# Altium footprint library JEDEC_G.PcbLib: 194 footprints (part 10 of 13)
Each footprint in its own frame and in the unit in brackets; x right, y up, seen from the top. Pads: shape width x height; smd on the part's side, far side on the other; paste and mask are expansions set on the pad; w line width, h text height; cw(c..) or ccw(c..) is an arc to the next point about the centre after c.
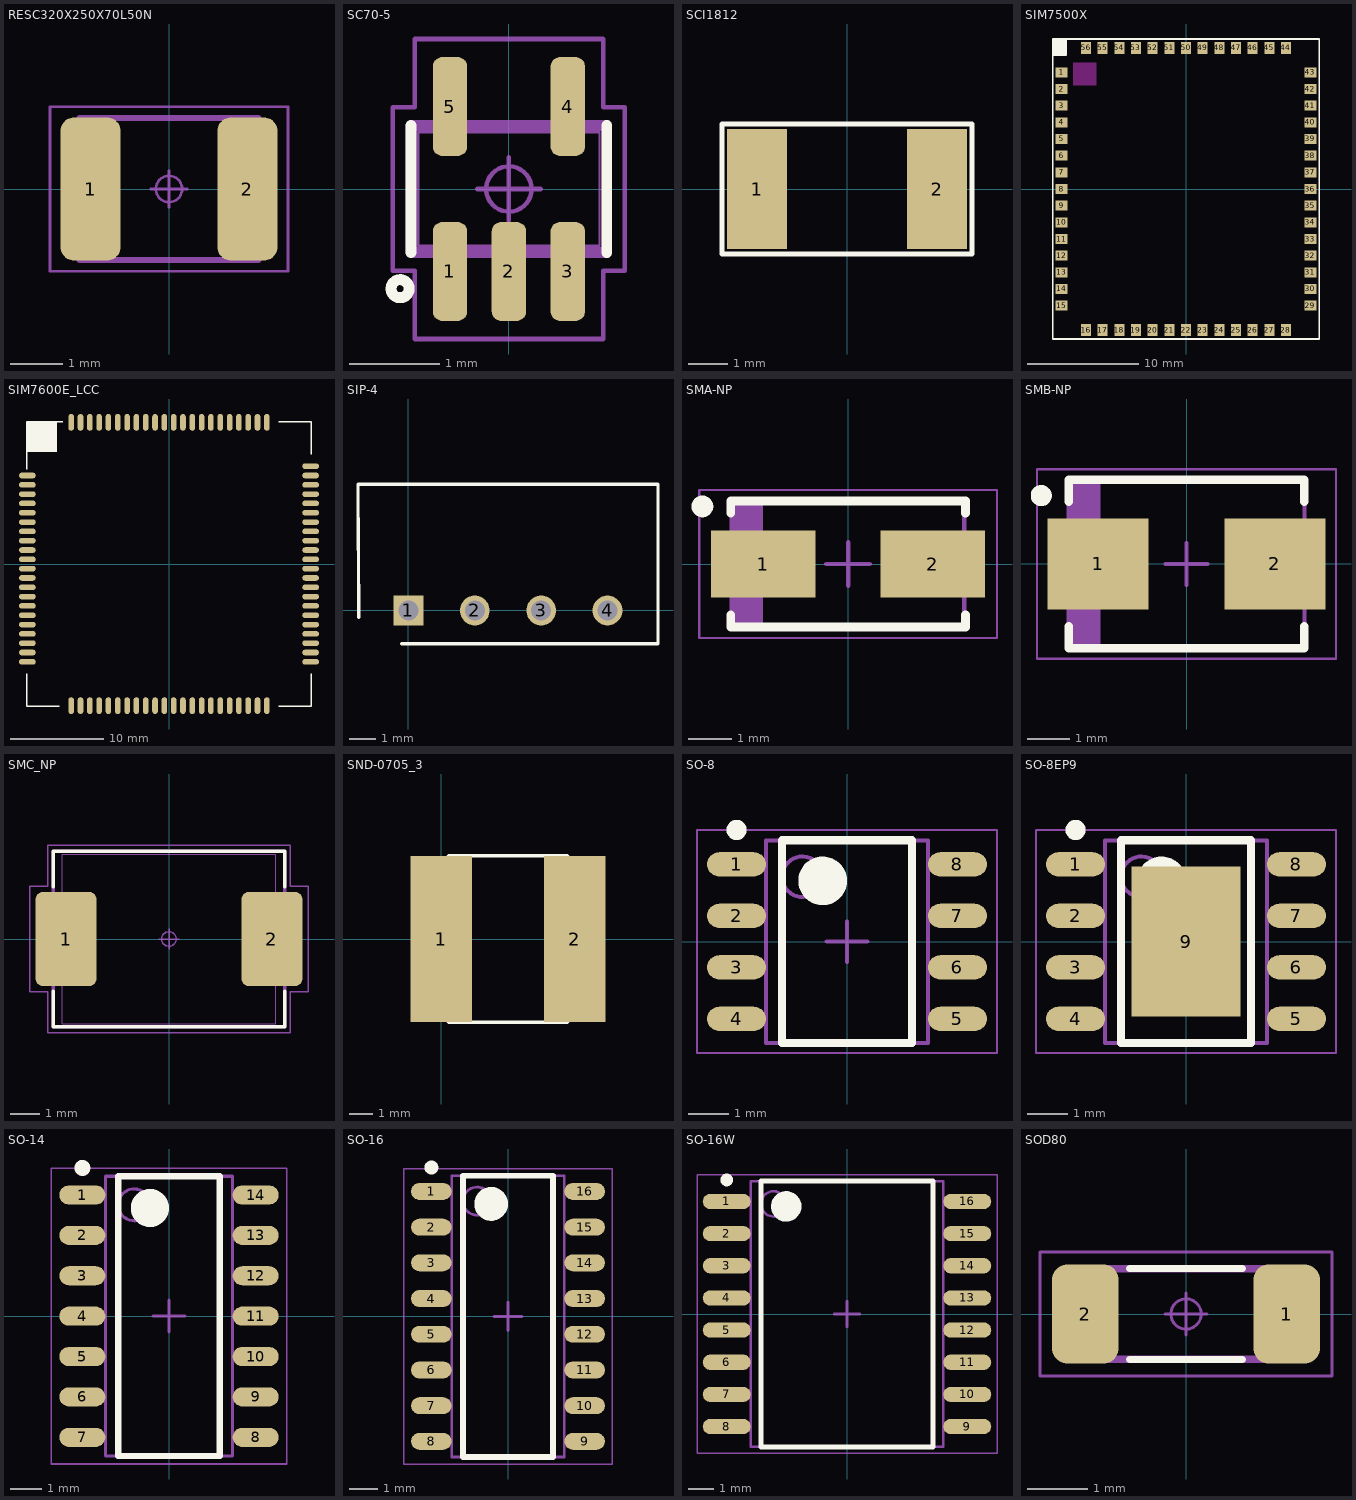
[diagram p9: the footprints below, top view; thin cyan lines are the x and y axes]

## RESC320X250X70L50N [mm] "Resistor, Chip; 3.20 mm L X 2.50 mm W X 0.70 mm H body"
height 0.7
pads (2):
  rrect44% 1.14x2.72 smd paste-2.72 mask+0: 1(-1.49,0) 2(1.49,0)
Mechanical 13:
  lines w0.12: -1.7,-1.35 -1.7,1.35 1.7,1.35 1.7,-1.35 -1.7,-1.35
Mechanical 15:
  circle w0.05: c0,0 r0.25
  lines w0.05: -0.35,0 0.35,0 ; 0,-0.35 0,0.35 ; -2.26,-1.56 -2.26,1.56 2.26,1.56 2.26,-1.56 -2.26,-1.56
3D body "RES-1210.stp": height 0.58, standoff 0, extent -1.6,-1.25 1.6,1.25

## SC70-5 [mm] "Small Outline Transistor (SOT23), 0.65 mm pitch; 5 pin, 2.00 mm L X 1.25 mm W X 1.10 mm H body"
height 1.1
pads (5):
  rrect53% 0.38x1.09 smd: 1(-0.65,-0.91) 2(0,-0.91) 3(0.65,-0.91) 4(0.65,0.91) 5(-0.65,0.91)
Top Overlay:
  circle w0.12: c-1.2,-1.1 r0.1
  lines w0.12: -1.08,-0.7 -1.08,0.7 ; 1.08,-0.7 1.08,0.7
Mechanical 11:
  lines w0.12: -1.08,-0.7 1.08,-0.7 1.08,0.7 -1.08,0.7 -1.08,-0.7
Mechanical 12:
  lines w0.025: -1,-0.625 1,-0.625 1,0.625 -1,0.625 -1,-0.625 ; -0.763,-1.05 -0.763,-0.69 -0.537,-0.69 -0.537,-1.05 -0.763,-1.05 ; -0.763,0.69 -0.763,1.05 -0.537,1.05 -0.537,0.69 -0.763,0.69 ; -0.112,-1.05 -0.112,-0.69 0.112,-0.69 0.112,-1.05 -0.112,-1.05 ; 0.537,-1.05 0.537,-0.69 0.763,-0.69 0.763,-1.05 0.537,-1.05 ; 0.537,0.69 0.537,1.05 0.763,1.05 0.763,0.69 0.537,0.69
Mechanical 15:
  circle w0.05: c0,0 r0.25
  lines w0.05: -0.35,0 0.35,0 ; 0,-0.35 0,0.35 ; -1.28,-0.9 -1.04,-0.9 -1.04,-1.655 1.04,-1.655 1.04,-0.9 1.28,-0.9 1.28,0.9 1.04,0.9 1.04,1.655 -1.04,1.655 -1.04,0.9 -1.28,0.9 -1.28,-0.9
3D body "SC70-5.STEP": height 1.1, standoff 0, extent -1,-1.05 1,1.05

## SCI1812 [mil]
pads (2):
  rect 60x120 smd: 1(-90,0) 2(90,0)
Top Overlay:
  lines w5: -125,-65 125,-65 125,65 -125,65 -125,-65
3D body "L_1812_4532Metric.step": height 98.43, standoff 0, extent -88.58,-62.99 88.58,63

## SIM7500X [mm]
pads (56):
  rect 1.1x0.9 smd mask+0.1: 1(-11.2,10.5) 2(-11.2,9) 3(-11.2,7.5) 4(-11.2,6) 5(-11.2,4.5) 6(-11.2,3) 7(-11.2,1.5) 8(-11.2,0) 9(-11.2,-1.5) 10(-11.2,-3) 11(-11.2,-4.5) 12(-11.2,-6) 13(-11.2,-7.5) 14(-11.2,-9) 15(-11.2,-10.5) 29(11.2,-10.5) 30(11.2,-9) 31(11.2,-7.5) 32(11.2,-6) 33(11.2,-4.5) 34(11.2,-3) 35(11.2,-1.5) 36(11.2,0) 37(11.2,1.5) 38(11.2,3) 39(11.2,4.5) 40(11.2,6) 41(11.2,7.5) 42(11.2,9) 43(11.2,10.5)
  rect 0.9x1.1 smd mask+0.1: 16(-9,-12.7) 17(-7.5,-12.7) 18(-6,-12.7) 19(-4.5,-12.7) 20(-3,-12.7) 21(-1.5,-12.7) 22(0,-12.7) 23(1.5,-12.7) 24(3,-12.7) 25(4.5,-12.7) 26(6,-12.7) 27(7.5,-12.7) 28(9,-12.7) 44(9,12.7) 45(7.5,12.7) 46(6,12.7) 47(4.5,12.7) 48(3,12.7) 49(1.5,12.7) 50(0,12.7) 51(-1.5,12.7) 52(-3,12.7) 53(-4.5,12.7) 54(-6,12.7) 55(-7.5,12.7) 56(-9,12.7)
Top Layer keep-out:
  rectangle: -10.15,9.3 -8.05,11.4
Top Overlay:
  region: -12,13.5 -11.938,13.438 -11.938,12.065 -10.795,12.065 -10.795,13.462
  lines w0.15: -11.938,12.065 -10.795,12.065 -10.795,13.462 ; -12,-13.5 -12,13.5 12,13.5 12,-13.5 -12,-13.5

## SIM7600E_LCC [mm]
pads (87):
  oval 1.8x0.6 smd: 1(-15.2,9.5) 2(-15.2,8.5) 3(-15.2,7.5) 4(-15.2,6.5) 5(-15.2,5.5) 6(-15.2,4.5) 7(-15.2,3.5) 8(-15.2,2.5) 9(-15.2,1.5) 10(-15.2,0.5) 11(-15.2,-0.5) 12(-15.2,-1.5) 13(-15.2,-2.5) 14(-15.2,-3.5) 15(-15.2,-4.5) 16(-15.2,-5.5) 17(-15.2,-6.5) 18(-15.2,-7.5) 19(-15.2,-8.5) 20(-15.2,-9.5) 41(15.2,-9.5) 42(15.2,-8.5) 43(15.2,-7.5) 44(15.2,-6.5) 45(15.2,-5.5) 46(15.2,-4.5) 47(15.2,-3.5) 48(15.2,-2.5) 49(15.2,-1.5) 50(15.2,-0.5) 51(15.2,0.5) 52(15.2,1.5) 53(15.2,2.5) 54(15.2,3.5) 55(15.2,4.5) 56(15.2,5.5) 57(15.2,6.5) 58(15.2,7.5) 59(15.2,8.5) 60(15.2,9.5) 81(-15.2,-10.5) 82(15.2,-10.5) 85(15.2,10.5)
  oval 0.6x1.8 smd: 21(-9.5,-15.2) 22(-8.5,-15.2) 23(-7.5,-15.2) 24(-6.5,-15.2) 25(-5.5,-15.2) 26(-4.5,-15.2) 27(-3.5,-15.2) 28(-2.5,-15.2) 29(-1.5,-15.2) 30(-0.5,-15.2) 31(0.5,-15.2) 32(1.5,-15.2) 33(2.5,-15.2) 34(3.5,-15.2) 35(4.5,-15.2) 36(5.5,-15.2) 37(6.5,-15.2) 38(7.5,-15.2) 39(8.5,-15.2) 40(9.5,-15.2) 61(9.5,15.2) 62(8.5,15.2) 63(7.5,15.2) 64(6.5,15.2) 65(5.5,15.2) 66(4.5,15.2) 67(3.5,15.2) 68(2.5,15.2) 69(1.5,15.2) 70(0.5,15.2) 71(-0.5,15.2) 72(-1.5,15.2) 73(-2.5,15.2) 74(-3.5,15.2) 75(-4.5,15.2) 76(-5.5,15.2) 77(-6.5,15.2) 78(-7.5,15.2) 79(-8.5,15.2) 80(-9.5,15.2) 83(10.5,-15.2) 84(-10.5,-15.2) 86(-10.5,15.2) 87(10.5,15.2)
Top Overlay:
  region: -15.254,12.065 -12.065,12.065 -12.065,15.254 -15.254,15.254
  lines w0.15: -15.254,-11.754 -15.254,-15.254 -11.754,-15.254 ; -15.254,10.16 -15.254,15.254 -11.43,15.254 ; 11.754,-15.254 15.254,-15.254 15.254,-11.754 ; 11.754,15.254 15.254,15.254 15.254,11.754
3D body "sim7600_as_pcba_181111.step": height 2.95, standoff 0.05, extent -15,-15 15,15

## SIP-4 [mil]
pads (4):
  rect 45x45 hole 30: 1(0,0)
  round 45 hole 30: 2(100,0) 3(200,0) 4(300,0)
Top Overlay:
  lines w5: -75,-10 -76,190 376,190 376,-50 -10,-50
3D body "Converter_DCDC_muRata_CRE1xxxxxx3C_THT.step": height 303.94, standoff -157.48, extent -81.5,-49.21 372.43,190.94

## SMA-NP [mm] "Molded Diode, 2-Leads, Body 5,07x2,57mm, IPC Medium Density"
height 2.65
pads (2):
  rect 2.4x1.55 smd: 1(-1.95,0) 2(1.95,0)
Top Overlay:
  circle w0.25: c-3.35,1.325 r0.125
  lines w0.2: -2.7,-1.175 -2.7,-1.45 2.7,-1.45 2.7,-1.175 ; -2.7,1.175 -2.7,1.45 2.7,1.45 2.7,1.175
Mechanical 13:
  rectangle: -2.675,-1.45 -1.955,1.45
  lines w0.1: -2.675,-1.45 2.675,-1.45 2.675,1.45 -2.675,1.45 -2.675,-1.45
Mechanical 15:
  lines w0.05: -3.425,-1.7 3.425,-1.7 3.425,1.7 -3.425,1.7 -3.425,-1.7
  lines w0.1: -0.5,0 0.5,0 ; 0,-0.5 0,0.5
3D body: height 1.27, standoff 0, extent -2.54,-2.537 2.54,2.537

## SMB-NP [mm] "Molded Diode, 2-Leads, Body 5,35x3,63mm, IPC Medium Density"
height 2.65
pads (2):
  rect 2.4x2.15 smd: 1(-2.1,0) 2(2.1,0)
Top Overlay:
  circle w0.25: c-3.45,1.625 r0.125
  lines w0.2: -2.8,-1.475 -2.8,-2 2.8,-2 2.8,-1.475 ; -2.8,1.475 -2.8,2 2.8,2 2.8,1.475
Mechanical 13:
  rectangle: -2.8,-1.975 -2.047,1.975
  lines w0.1: -2.8,-1.975 -2.8,1.975 2.8,1.975 2.8,-1.975 -2.8,-1.975
Mechanical 15:
  lines w0.05: -3.55,-2.25 -3.55,2.25 3.55,2.25 3.55,-2.25 -3.55,-2.25
  lines w0.1: -0.5,0 0.5,0 ; 0,-0.5 0,0.5
3D body "DIOM5336X26N.step": height 2.65, standoff 0, extent -3.02,-1.975 3.02,1.975

## SMC_NP [mm] "Diode, Non-Polarized, Molded Body; 7.30 mm L X 5.80 mm W X 2.50 mm H body"
height 2.5
pads (2):
  rrect24% 2.09x3.22 smd: 1(-3.515,0) 2(3.515,0)
Top Overlay:
  lines w0.12: -3.95,-1.79 -3.95,-3 3.95,-3 3.95,-1.79 ; -3.95,1.79 -3.95,3 3.95,3 3.95,1.79
Mechanical 11:
  lines w0.12: -3.95,-3 -3.95,3 3.95,3 3.95,-3 -3.95,-3
Mechanical 12:
  lines w0.025: -3.95,-1.5 -2.75,-1.5 -2.75,1.5 -3.95,1.5 -3.95,-1.5 ; -3.65,-2.9 -3.65,2.9 3.65,2.9 3.65,-2.9 -3.65,-2.9 ; 2.75,-1.5 2.75,1.5 3.95,1.5 3.95,-1.5 2.75,-1.5
Mechanical 15:
  circle w0.05: c0,0 r0.25
  lines w0.05: -0.35,0 0.35,0 ; 0,-0.35 0,0.35 ; -4.76,-1.81 -4.76,1.81 -4.15,1.81 -4.15,3.2 4.15,3.2 4.15,1.81 4.76,1.81 4.76,-1.81 4.15,-1.81 4.15,-3.2 -4.15,-3.2 -4.15,-1.81 -4.76,-1.81
Mechanical 16:
  text ".Designator" at 0,0 h1.2
3D body "DIONM790X580X250L120X300.STEP": height 2.5, standoff 0, extent -3.95,-2.9 3.95,2.9

## SND-0705_3 [mm]
height 5
pads (2):
  rect 2.6x7 smd: 1(0,0) 2(5.625,0)
Top Overlay:
  lines w0.15: 0.325,-3.5 cw(c3.825,0) 0.325,3.5 5.3,3.5 cw(c1.8,0) 5.3,-3.5 0.325,-3.5
3D body "SMD_Inductor_CD75.step": height 4.98, standoff -0.01, extent -1.1,-3.5 6.7,3.5

## SO-8 [mm] "SOIC, 8-Leads, Body 4,90x3,90mm, Pitch 1,27mm, IPC Medium Density"
height 1.75
pads (8):
  oval 1.45x0.6 smd: 1(-2.725,1.905) 2(-2.725,0.635) 3(-2.725,-0.635) 4(-2.725,-1.905) 5(2.725,-1.905) 6(2.725,-0.635) 7(2.725,0.635) 8(2.725,1.905)
Top Overlay:
  circle w0.6: c-0.6,1.5 r0.3
  circle w0.25: c-2.725,2.755 r0.125
  lines w0.2: -1.6,-2.5 1.6,-2.5 1.6,2.5 -1.6,2.5 -1.6,-2.5
Mechanical 13:
  circle w0.1: c-1.1,1.6 r0.5
  lines w0.1: -2,-2.5 2,-2.5 2,2.5 -2,2.5 -2,-2.5
Mechanical 15:
  lines w0.05: -3.7,-2.75 3.7,-2.75 3.7,2.75 -3.7,2.75 -3.7,-2.75
  lines w0.1: -0.5,0 0.5,0 ; 0,-0.5 0,0.5
3D body "SOIC127P600X175-8N.step": height 1.75, standoff 0, extent -3,-2.5 3,2.5

## SO-8EP9 [mm] "SOIC, 8-Leads, Body 4,90x3,90mm, Pitch 1,27mm, IPC Medium Density"
height 1.75
pads (9):
  oval 1.45x0.6 smd: 1(-2.725,1.905) 2(-2.725,0.635) 3(-2.725,-0.635) 4(-2.725,-1.905) 5(2.725,-1.905) 6(2.725,-0.635) 7(2.725,0.635) 8(2.725,1.905)
  rect 2.7x3.7 smd: 9(0,0)
Top Overlay:
  circle w0.6: c-0.6,1.5 r0.3
  circle w0.25: c-2.725,2.755 r0.125
  lines w0.2: -1.6,-2.5 1.6,-2.5 1.6,2.5 -1.6,2.5 -1.6,-2.5
Mechanical 13:
  circle w0.1: c-1.1,1.6 r0.5
  lines w0.1: -2,-2.5 2,-2.5 2,2.5 -2,2.5 -2,-2.5
Mechanical 15:
  lines w0.05: -3.7,-2.75 3.7,-2.75 3.7,2.75 -3.7,2.75 -3.7,-2.75
  lines w0.1: -0.5,0 0.5,0 ; 0,-0.5 0,0.5
3D body "SOIC-8-1EP_3.9x4.9mm_P1.27mm_EP2.35x2.35mm.step": height 1.75, standoff 0, extent -3,-2.45 3,2.45

## SO-14 [mm] "SOIC, 14-Leads, Body 8,65x3,90mm, Pitch 1,27mm, IPC Medium Density"
height 1.75
pads (14):
  oval 1.45x0.6 smd: 1(-2.725,3.81) 2(-2.725,2.54) 3(-2.725,1.27) 4(-2.725,0) 5(-2.725,-1.27) 6(-2.725,-2.54) 7(-2.725,-3.81) 8(2.725,-3.81) 9(2.725,-2.54) 10(2.725,-1.27) 11(2.725,0) 12(2.725,1.27) 13(2.725,2.54) 14(2.725,3.81)
Top Overlay:
  circle w0.25: c-2.725,4.66 r0.125
  circle w0.6: c-0.6,3.4 r0.3
  lines w0.2: -1.6,-4.4 -1.6,4.4 1.6,4.4 1.6,-4.4 -1.6,-4.4
Mechanical 13:
  circle w0.1: c-1.1,3.5 r0.5
  lines w0.1: -2,-4.4 -2,4.4 2,4.4 2,-4.4 -2,-4.4
Mechanical 15:
  lines w0.05: -3.7,-4.65 -3.7,4.65 3.7,4.65 3.7,-4.65 -3.7,-4.65
  lines w0.1: -0.5,0 0.5,0 ; 0,-0.5 0,0.5
3D body "SOIC-14_3.9x8.7mm_P1.27mm.step": height 1.75, standoff 0, extent -3,-4.35 3,4.35

## SO-16 [mm] "SOIC, 16-Leads, Body 9,90x3,90mm, Pitch 1,27mm, IPC Medium Density"
height 1.75
pads (16):
  oval 1.45x0.6 smd: 1(-2.725,4.445) 2(-2.725,3.175) 3(-2.725,1.905) 4(-2.725,0.635) 5(-2.725,-0.635) 6(-2.725,-1.905) 7(-2.725,-3.175) 8(-2.725,-4.445) 9(2.725,-4.445) 10(2.725,-3.175) 11(2.725,-1.905) 12(2.725,-0.635) 13(2.725,0.635) 14(2.725,1.905) 15(2.725,3.175) 16(2.725,4.445)
Top Overlay:
  circle w0.6: c-0.6,4 r0.3
  circle w0.25: c-2.725,5.295 r0.125
  lines w0.2: -1.6,-5 1.6,-5 1.6,5 -1.6,5 -1.6,-5
Mechanical 13:
  circle w0.1: c-1.1,4.1 r0.5
  lines w0.1: -2,-5 2,-5 2,5 -2,5 -2,-5
Mechanical 15:
  lines w0.05: -3.7,-5.25 3.7,-5.25 3.7,5.25 -3.7,5.25 -3.7,-5.25
  lines w0.1: -0.5,0 0.5,0 ; 0,-0.5 0,0.5
3D body "SOIC-16_3.9x9.9mm_P1.27mm.step": height 1.75, standoff 0, extent -3,-4.95 3,4.95

## SO-16W [mm] "SOIC, 16-Leads, Body 10,30x7,50mm, Pitch 1,27mm, IPC Medium Density"
height 2.65
pads (16):
  oval 1.9x0.6 smd: 1(-4.75,4.445) 2(-4.75,3.175) 3(-4.75,1.905) 4(-4.75,0.635) 5(-4.75,-0.635) 6(-4.75,-1.905) 7(-4.75,-3.175) 8(-4.75,-4.445) 9(4.75,-4.445) 10(4.75,-3.175) 11(4.75,-1.905) 12(4.75,-0.635) 13(4.75,0.635) 14(4.75,1.905) 15(4.75,3.175) 16(4.75,4.445)
Top Overlay:
  circle w0.6: c-2.4,4.25 r0.3
  circle w0.25: c-4.75,5.295 r0.125
  lines w0.2: -3.4,-5.25 3.4,-5.25 3.4,5.25 -3.4,5.25 -3.4,-5.25
Mechanical 13:
  circle w0.1: c-2.9,4.35 r0.5
  lines w0.1: -3.8,-5.25 3.8,-5.25 3.8,5.25 -3.8,5.25 -3.8,-5.25
Mechanical 15:
  lines w0.05: -5.925,-5.5 5.925,-5.5 5.925,5.5 -5.925,5.5 -5.925,-5.5
  lines w0.1: -0.5,0 0.5,0 ; 0,-0.5 0,0.5
3D body "SOIC-16W_7.5x10.3mm_P1.27mm.step": height 2.75, standoff 0, extent -5.15,-5.15 5.15,5.15

## SOD80 [mm] "Diode, Metal Electrode Leadless Face (MELF); 3.45 mm L X 1.40 mm Dia body"
height 1.5
pads (2):
  rrect45% 1.1x1.63 smd: 1(1.66,0) 2(-1.66,0)
Top Overlay:
  lines w0.12: -0.93,-0.75 0.93,-0.75 ; -0.93,0.75 0.93,0.75
Mechanical 11:
  lines w0.12: -1.8,-0.75 1.8,-0.75 1.8,0.75 -1.8,0.75 -1.8,-0.75
Mechanical 12:
  lines w0.025: -1.725,-0.7 1.725,-0.7 ; -1.725,-0.7 -1.725,0.7 ; -1.725,-0.7 -1.725,0.7 ; -1.725,-0.7 -1.325,-0.7 -1.325,0.7 -1.725,0.7 ; -1.725,0.7 1.725,0.7 ; 1.725,-0.7 1.725,0.7 ; 1.725,-0.7 1.325,-0.7 1.325,0.7 1.725,0.7 ; 1.725,-0.7 1.725,0.7
Mechanical 15:
  circle w0.05: c0,0 r0.25
  lines w0.05: -0.35,0 0.35,0 ; 0,-0.35 0,0.35 ; -2.41,-1.02 2.41,-1.02 2.41,1.02 -2.41,1.02 -2.41,-1.02
3D body "DIOMELF345X140L40.STEP": height 1.4, standoff 0, extent -1.725,-0.7 1.725,0.7